# Altium footprint library Funk.PcbLib: 34 footprints (part 2 of 3)
Each footprint in its own frame and in the unit in brackets; x right, y up, seen from the top. Pads: shape width x height; smd on the part's side, far side on the other; paste and mask are expansions set on the pad; w line width, h text height; cw(c..) or ccw(c..) is an arc to the next point about the centre after c.
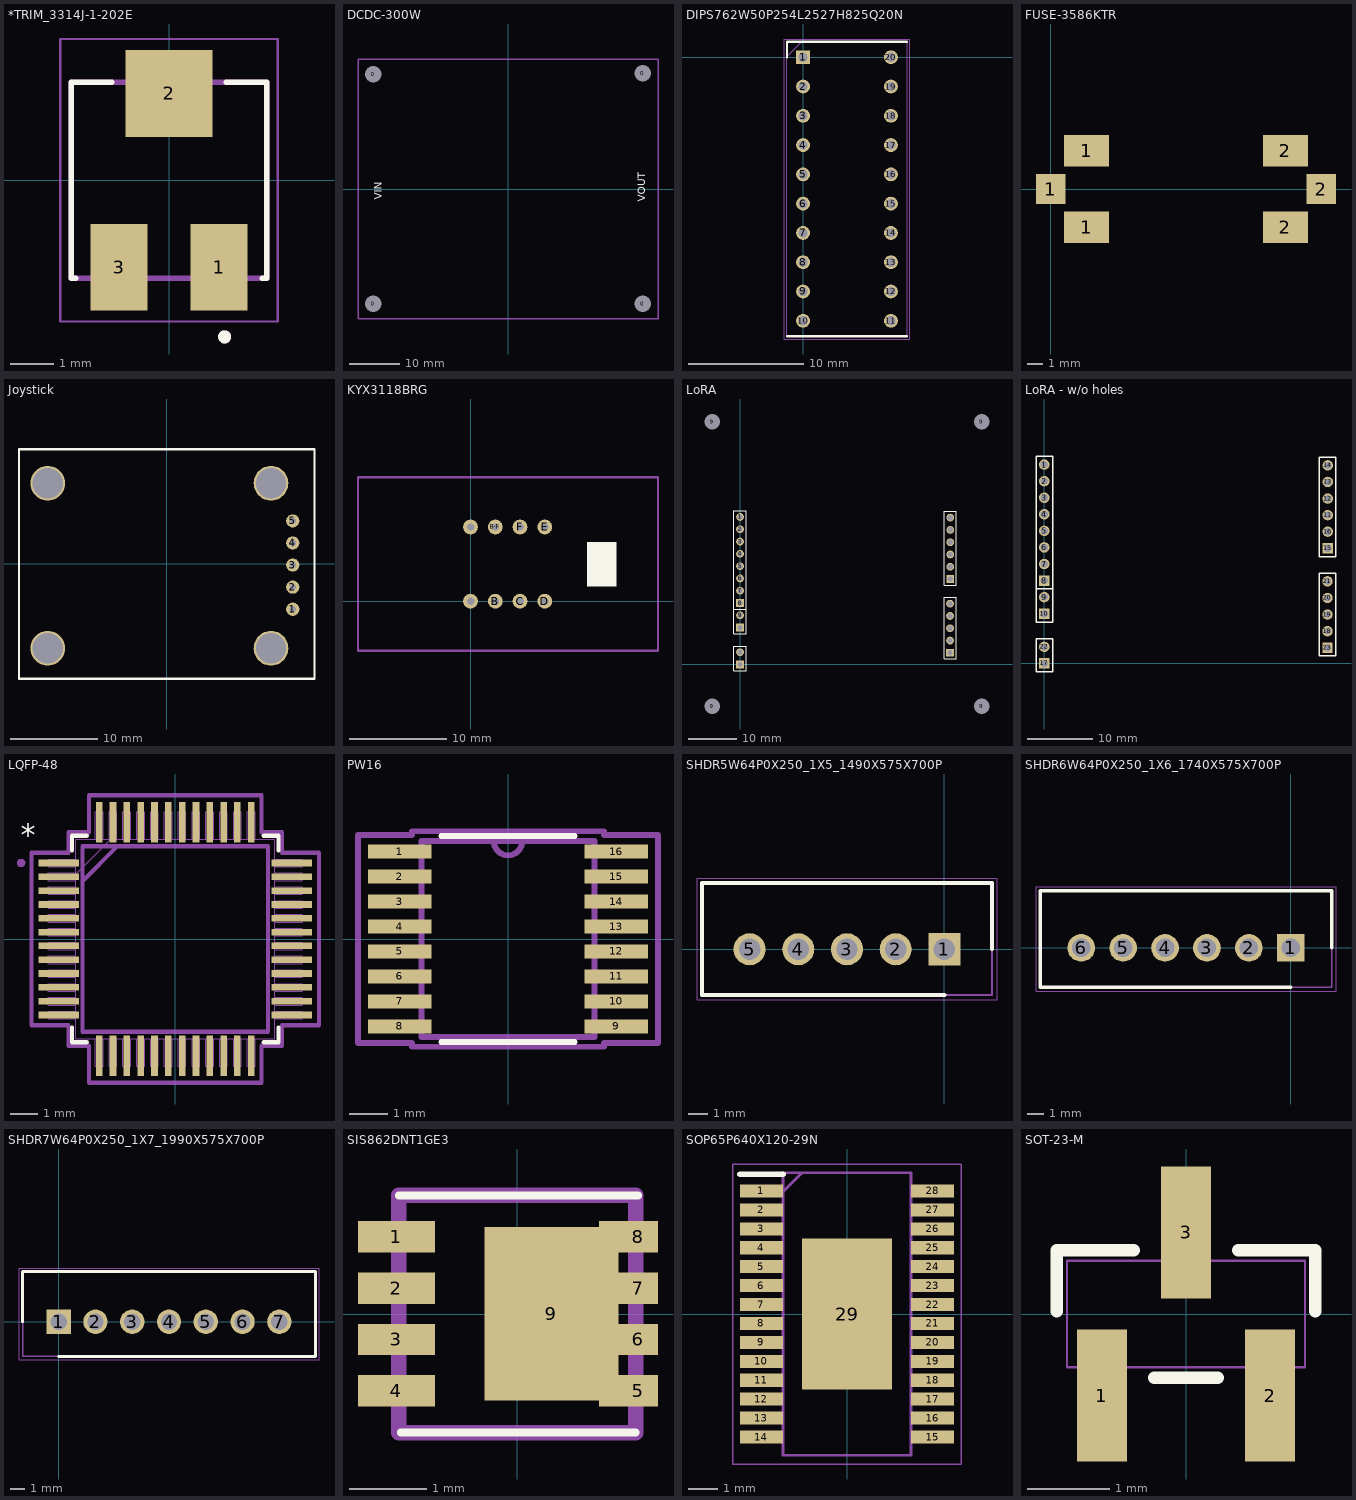
[diagram p1: the footprints below, top view; thin cyan lines are the x and y axes]

## *TRIM_3314J-1-202E [mm]
pads (3):
  rect 1.3x2 smd: 1(1.15,-2) 3(-1.15,-2)
  rect 2x2 smd: 2(0,2)
Top Overlay:
  circle w0.2: c1.28,-3.6 r0.05
  lines w0.127: -2.15,-2.25 -2.25,-2.25 -2.25,2.25 -1.315,2.25 ; 1.315,2.25 2.25,2.25 2.25,-2.25 2.15,-2.25
Mechanical 4:
  circle w0.2: c1.28,-3.6 r0.05
  circle w0.2: c1.28,-3.6 r0.05
  lines w0.127: -2.25,-2.25 -2.25,2.25 ; -2.25,-2.25 2.25,-2.25 ; -2.25,-2.25 -2.25,2.25 ; -2.25,-2.25 2.25,-2.25 ; -2.25,2.25 2.25,2.25 ; -2.25,2.25 2.25,2.25 ; 2.25,-2.25 2.25,2.25 ; 2.25,-2.25 2.25,2.25
Mechanical 16:
  lines w0.05: -2.5,-3.25 -2.5,3.25 2.5,3.25 2.5,-3.25 -2.5,-3.25
3D body "3314J1.stp": height 2.7, standoff -0.02, extent -2.5,-2.563 2.5,2.44

## DCDC-300W [mil] "6-36V 20A"
pads (4):
  round 60 hole 129.92 unplated: 0(-1060,-905) 0(-1060,905) 0(1060,-905) 0(1060,910)
Top Overlay:
  text "VOUT" at 1080,-100 h60
  text "VIN" at -995,-85 h60
Mechanical 1:
  lines w10: -1181.1,-1023.62 -1181.1,1023.62 1181.1,1023.62 1181.1,-1023.62 -1181.1,-1023.62
3D body "DCDC.STEP": height 1146.34, standoff 0, extent -1181.1,-1185.89 1181.1,1199.34

## DIPS762W50P254L2527H825Q20N [mm]
pads (20):
  rect 1.2x1.2 / inner round 1.2 / far side rect 1.2x1.2 hole 0.8: 1(0,0)
  round 1.2 hole 0.8: 2(0,-2.54) 3(0,-5.08) 4(0,-7.62) 5(0,-10.16) 6(0,-12.7) 7(0,-15.24) 8(0,-17.78) 9(0,-20.32) 10(0,-22.86) 11(7.62,-22.86) 12(7.62,-20.32) 13(7.62,-17.78) 14(7.62,-15.24) 15(7.62,-12.7) 16(7.62,-10.16) 17(7.62,-7.62) 18(7.62,-5.08) 19(7.62,-2.54) 20(7.62,0)
Top Overlay:
  lines w0.2: -1.395,-24.19 9.015,-24.19 ; -1.395,0 -1.395,1.33 9.015,1.33
Mechanical 15:
  lines w0.1: -1.395,0.06 -0.125,1.33 ; -1.395,-24.19 -1.395,1.33 9.015,1.33 9.015,-24.19 -1.395,-24.19
Mechanical 20:
  lines w0.05: -1.645,-24.44 -1.645,1.58 9.265,1.58 9.265,-24.44 -1.645,-24.44

## FUSE-3586KTR [mm]
pads (6):
  rect 1.9x1.9 smd: 1(0,0) 2(17.34,0)
  rect 2.9x2 smd: 1(2.29,-2.45) 1(2.29,2.45) 2(15.05,-2.45) 2(15.05,2.45)

## Joystick [mil]
pads (9):
  round 60 hole 30: 1(571.16,-205.04) 2(571.16,-105.04) 3(571.16,-5.04) 4(571.16,94.96) 5(571.16,194.96)
  round 157.48 hole 137.8 unplated: ""(-539.08,-382.2) ""(-539.08,365.83) ""(472.73,-382.2) ""(472.73,365.83)
Top Overlay:
  lines w10: -669,-520 669.58,-520 669.58,519.37 -669,519.37 -669,-520
Mechanical 1:
  pour cut-out: 630.21,503.62
  pour cut-out: -669,-244.41
  pour cut-out: -669,-520

## KYX3118BRG [mil]
pads (8):
  round 60 hole 30: A-IN(0,300) A-OUT(0,0) B(100,0) B-F(100,300) C(200,0) D(300,0) E(300,300) F(200,300)
Top Overlay:
  rectangle: 470,60 590,240
Mechanical 1:
  lines w10: -455,-200 -455,500.79 757.6,500.79 757.6,-200 -455,-200

## LoRA [mm]
pads (27):
  round 1.6 hole 1.1: 1(0,30.48) 2(0,27.94) 3(0,25.4) 4(0,22.86) 5(0,20.32) 6(0,17.78) 7(0,15.24) 9(0,10.16) 11(43.434,22.733) 12(43.434,25.273) 13(43.434,27.813) 14(43.434,30.353) 16(43.434,20.193) 18(43.4,4.953) 19(43.4,7.493) 20(43.4,10.033) 21(43.4,12.573) 22(0,2.54)
  rect 1.6x1.6 hole 1.1: 8(0,12.7) 10(0,7.62) 15(43.434,17.653) 17(0,0) 23(43.4,2.413)
  round 1.524 hole 3.2 unplated: 9(-5.715,-8.636) 9(-5.715,50.165) 9(49.911,-8.636) 9(49.911,50.165)
Top Overlay:
  lines w0.2: -1.27,3.81 -1.27,-1.27 1.27,-1.27 1.27,3.81 ; -1.27,3.81 1.27,3.81 ; -1.27,3.81 1.27,3.81 ; -1.27,11.43 1.27,11.43 ; -1.27,11.43 -1.27,31.75 1.27,31.75 1.27,11.43 ; -1.27,11.43 1.27,11.43 ; -1.27,11.43 -1.27,6.35 1.27,6.35 1.27,11.43 ; 42.164,1.143 44.704,1.143 44.704,13.843 42.164,13.843 42.164,1.143 ; 42.164,16.383 42.164,31.623 44.704,31.623 44.704,16.383 42.164,16.383
3D body "lora-modul.step": height 10.3, standoff -3, extent -8.7,-11.684 52.895,53.213

## LoRA - w/o holes [mm]
pads (23):
  round 1.6 hole 1.1: 1(0,30.48) 2(0,27.94) 3(0,25.4) 4(0,22.86) 5(0,20.32) 6(0,17.78) 7(0,15.24) 9(0,10.16) 11(43.434,22.733) 12(43.434,25.273) 13(43.434,27.813) 14(43.434,30.353) 16(43.434,20.193) 18(43.4,4.953) 19(43.4,7.493) 20(43.4,10.033) 21(43.4,12.573) 22(0,2.54)
  rect 1.6x1.6 hole 1.1: 8(0,12.7) 10(0,7.62) 15(43.434,17.653) 17(0,0) 23(43.4,2.413)
Top Overlay:
  lines w0.2: -1.27,3.81 1.27,3.81 ; -1.27,3.81 1.27,3.81 ; -1.27,3.81 -1.27,-1.27 1.27,-1.27 1.27,3.81 ; -1.27,11.43 -1.27,6.35 1.27,6.35 1.27,11.43 ; -1.27,11.43 1.27,11.43 ; -1.27,11.43 -1.27,31.75 1.27,31.75 1.27,11.43 ; -1.27,11.43 1.27,11.43 ; 42.164,1.143 42.164,13.843 44.704,13.843 44.704,1.143 42.164,1.143 ; 42.164,16.383 44.704,16.383 44.704,31.623 42.164,31.623 42.164,16.383
3D body "lora-modul.step": height 10.3, standoff -3, extent -8.7,-11.684 52.895,53.213

## LQFP-48 [mm]
pads (48):
  rect 1.462x0.239 smd: 1(-4.216,2.75) 2(-4.216,2.25) 3(-4.216,1.75) 4(-4.216,1.25) 5(-4.216,0.75) 6(-4.216,0.25) 7(-4.216,-0.25) 8(-4.216,-0.75) 9(-4.216,-1.25) 10(-4.216,-1.75) 11(-4.216,-2.25) 12(-4.216,-2.75) 25(4.216,-2.75) 26(4.216,-2.25) 27(4.216,-1.75) 28(4.216,-1.25) 29(4.216,-0.75) 30(4.216,-0.25) 31(4.216,0.25) 32(4.216,0.75) 33(4.216,1.25) 34(4.216,1.75) 35(4.216,2.25) 36(4.216,2.75)
  rect 0.239x1.462 smd: 13(-2.75,-4.216) 14(-2.25,-4.216) 15(-1.75,-4.216) 16(-1.25,-4.216) 17(-0.75,-4.216) 18(-0.25,-4.216) 19(0.25,-4.216) 20(0.75,-4.216) 21(1.25,-4.216) 22(1.75,-4.216) 23(2.25,-4.216) 24(2.75,-4.216) 37(2.75,4.216) 38(2.25,4.216) 39(1.75,4.216) 40(1.25,4.216) 41(0.75,4.216) 42(0.25,4.216) 43(-0.25,4.216) 44(-0.75,4.216) 45(-1.25,4.216) 46(-1.75,4.216) 47(-2.25,4.216) 48(-2.75,4.216)
Top Overlay:
  lines w0.152: -3.734,-3.202 -3.734,-3.734 -3.202,-3.734 ; -3.734,3.202 -3.734,3.734 -3.202,3.734 ; 3.202,-3.734 3.734,-3.734 3.734,-3.202 ; 3.202,3.734 3.734,3.734 3.734,3.202
  text "*" at -5.582,3.381 h0.79
Mechanical 1:
  drawing of 197 lines, arcs and shapes, not listed
  text "*" at -3.226,3 h0.79
Mechanical 16:
  circle w0.152: c-5.575,2.75 r0.076
  lines w0.152: -3.358,2.088 -2.088,3.358 ; -5.201,-3.124 -5.201,3.124 -3.861,3.124 -3.861,3.861 -3.124,3.861 -3.124,5.201 3.124,5.201 3.124,3.861 3.861,3.861 3.861,3.124 5.201,3.124 5.201,-3.124 3.861,-3.124 3.861,-3.861 3.124,-3.861 3.124,-5.201 -3.124,-5.201 -3.124,-3.861 -3.861,-3.861 -3.861,-3.124 -5.201,-3.124 ; -3.358,-3.358 3.358,-3.358 3.358,3.358 -3.358,3.358 -3.358,-3.358
3D body "LQFP-48.step": height 1.6, standoff 0, extent -4.597,-4.597 4.597,4.597

## PW16 [mm]
pads (16):
  rect 1.665x0.365 smd: 1(-2.819,2.275) 2(-2.819,1.625) 3(-2.819,0.975) 4(-2.819,0.325) 5(-2.819,-0.325) 6(-2.819,-0.975) 7(-2.819,-1.625) 8(-2.819,-2.275) 9(2.819,-2.275) 10(2.819,-1.625) 11(2.819,-0.975) 12(2.819,-0.325) 13(2.819,0.325) 14(2.819,0.975) 15(2.819,1.625) 16(2.819,2.275)
Top Overlay:
  lines w0.152: -1.739,-2.68 1.739,-2.68 ; -1.739,2.68 1.739,2.68
Mechanical 1:
  lines w0.025: -0.305,2.553 ccw(c0,2.553) 0.305,2.553 ; -3.302,-2.427 -2.248,-2.427 -2.248,-2.123 -3.302,-2.123 -3.302,-2.427 ; -3.302,-1.777 -2.248,-1.777 -2.248,-1.473 -3.302,-1.473 -3.302,-1.777 ; -3.302,-1.127 -2.248,-1.127 -2.248,-0.823 -3.302,-0.823 -3.302,-1.127 ; -3.302,-0.477 -2.248,-0.477 -2.248,-0.173 -3.302,-0.173 -3.302,-0.477 ; -3.302,0.173 -2.248,0.173 -2.248,0.477 -3.302,0.477 -3.302,0.173 ; -3.302,0.823 -2.248,0.823 -2.248,1.127 -3.302,1.127 -3.302,0.823 ; -3.302,1.473 -2.248,1.473 -2.248,1.777 -3.302,1.777 -3.302,1.473 ; -3.302,2.123 -2.248,2.123 -2.248,2.427 -3.302,2.427 -3.302,2.123 ; -2.248,-2.553 -2.248,2.553 2.248,2.553 2.248,-2.553 -2.248,-2.553 ; 2.248,-2.427 3.302,-2.427 3.302,-2.123 2.248,-2.123 2.248,-2.427 ; 2.248,-1.777 3.302,-1.777 3.302,-1.473 2.248,-1.473 2.248,-1.777 ; 2.248,-1.127 3.302,-1.127 3.302,-0.823 2.248,-0.823 2.248,-1.127 ; 2.248,-0.477 3.302,-0.477 3.302,-0.173 2.248,-0.173 2.248,-0.477 ; 2.248,0.173 3.302,0.173 3.302,0.477 2.248,0.477 2.248,0.173 ; 2.248,0.823 3.302,0.823 3.302,1.127 2.248,1.127 2.248,0.823 ; 2.248,1.473 3.302,1.473 3.302,1.777 2.248,1.777 2.248,1.473 ; 2.248,2.123 3.302,2.123 3.302,2.427 2.248,2.427 2.248,2.123
Mechanical 16:
  lines w0.152: -0.375,2.553 ccw(c0,2.553) 0.375,2.553 ; -3.906,-2.711 -2.502,-2.711 -2.502,-2.807 2.502,-2.807 2.502,-2.711 3.906,-2.711 3.906,2.711 2.502,2.711 2.502,2.807 -2.502,2.807 -2.502,2.711 -3.906,2.711 -3.906,-2.711 ; -2.248,-2.553 2.248,-2.553 2.248,2.553 -2.248,2.553 -2.248,-2.553
3D body "PW16.step": height 1.2, standoff 0, extent -3.302,-2.593 3.302,2.513

## SHDR5W64P0X250_1X5_1490X575X700P [mm]
pads (5):
  rect 1.65x1.65 / inner round 1.65 / far side rect 1.65x1.65 hole 1.1: 1(0,0)
  round 1.65 hole 1.1: 2(-2.5,0) 3(-5,0) 4(-7.5,0) 5(-10,0)
Top Overlay:
  lines w0.2: 0,-2.35 -12.45,-2.35 -12.45,3.4 2.45,3.4 2.45,0
Mechanical 15:
  lines w0.1: -12.45,-2.35 -12.45,3.4 2.45,3.4 2.45,-2.35 -12.45,-2.35
Mechanical 20:
  lines w0.05: -12.7,-2.6 -12.7,3.65 2.7,3.65 2.7,-2.6 -12.7,-2.6
3D body "jst-b5b-xh-a.step": height 7, standoff -3.4, extent -12.403,-3.337 2.497,2.413

## SHDR6W64P0X250_1X6_1740X575X700P [mm]
pads (6):
  rect 1.65x1.65 / inner round 1.65 / far side rect 1.65x1.65 hole 1.1: 1(0,0)
  round 1.65 hole 1.1: 2(-2.5,0) 3(-5,0) 4(-7.5,0) 5(-10,0) 6(-12.5,0)
Top Overlay:
  lines w0.2: 0,-2.35 -14.95,-2.35 -14.95,3.4 2.45,3.4 2.45,0
Mechanical 15:
  lines w0.1: -14.95,-2.35 2.45,-2.35 2.45,3.4 -14.95,3.4 -14.95,-2.35
Mechanical 20:
  lines w0.05: -15.2,-2.6 2.7,-2.6 2.7,3.65 -15.2,3.65 -15.2,-2.6
3D body "jst-b6b-xh-a.step": height 7, standoff -3.4, extent -14.923,-3.429 2.477,2.321

## SHDR7W64P0X250_1X7_1990X575X700P [mm]
pads (7):
  rect 1.65x1.65 / inner round 1.65 / far side rect 1.65x1.65 hole 1.1: 1(0,0)
  round 1.65 hole 1.1: 2(2.5,0) 3(5,0) 4(7.5,0) 5(10,0) 6(12.5,0) 7(15,0)
Top Overlay:
  lines w0.2: -2.45,0 -2.45,3.4 17.45,3.4 17.45,-2.35 0,-2.35
Mechanical 15:
  lines w0.1: -2.45,-2.35 -2.45,3.4 17.45,3.4 17.45,-2.35 -2.45,-2.35
Mechanical 20:
  lines w0.05: -2.7,-2.6 -2.7,3.65 17.7,3.65 17.7,-2.6 -2.7,-2.6
3D body "User Library-B7B-XH-A.step": height 7, standoff -3.4, extent -2.45,-2.35 17.45,3.4

## SIS862DNT1GE3 [mm]
pads (11):
  rect 0.99x0.405 smd: 1(-1.555,0.992) 2(-1.555,0.332) 3(-1.555,-0.328) 4(-1.555,-0.988)
  rect 0.51x0.405 smd: 5(1.555,-0.988) 6(1.555,-0.328) 7(1.555,0.332) 8(1.555,0.992)
  rect 1.725x2.235 smd: 9(0.438,0.002)
  rect 0.25x0.077 smd: 10(1.176,-1.15) 11(1.175,1.156)
Top Overlay:
  lines w0.1: -1.525,1.525 1.555,1.525 ; -1.5,-1.525 1.525,-1.525
Mechanical 13:
  lines w0.2: -1.525,-1.525 -1.525,1.525 1.525,1.525 1.525,-1.525 -1.525,-1.525

## SOP65P640X120-29N [mm]
pads (29):
  rect 1.475x0.45 smd: 1(-2.938,4.225) 2(-2.938,3.575) 3(-2.938,2.925) 4(-2.938,2.275) 5(-2.938,1.625) 6(-2.938,0.975) 7(-2.938,0.325) 8(-2.938,-0.325) 9(-2.938,-0.975) 10(-2.938,-1.625) 11(-2.938,-2.275) 12(-2.938,-2.925) 13(-2.938,-3.575) 14(-2.938,-4.225) 15(2.938,-4.225) 16(2.938,-3.575) 17(2.938,-2.925) 18(2.938,-2.275) 19(2.938,-1.625) 20(2.938,-0.975) 21(2.938,-0.325) 22(2.938,0.325) 23(2.938,0.975) 24(2.938,1.625) 25(2.938,2.275) 26(2.938,2.925) 27(2.938,3.575) 28(2.938,4.225)
  rect 3.1x5.18 smd: 29(0,0)
Top Overlay:
  lines w0.2: -3.675,4.8 -2.2,4.8
Mechanical 15:
  lines w0.1: -2.2,4.2 -1.55,4.85 ; -2.2,-4.85 2.2,-4.85 2.2,4.85 -2.2,4.85 -2.2,-4.85
Mechanical 20:
  lines w0.05: -3.925,-5.15 3.925,-5.15 3.925,5.15 -3.925,5.15 -3.925,-5.15
3D body "DRV8840PWP.stp": height 1.2, standoff 0, extent -3.2,-4.85 3.2,4.85

## SOT-23-M [mm]
pads (3):
  rect 0.61x1.61 smd paste+0 mask+0: 1(-1.025,-0.995) 2(1.025,-0.995) 3(0,0.995)
Top Overlay:
  lines w0.152: -1.577,0.033 -1.577,0.777 -0.638,0.777 ; -0.387,-0.777 0.387,-0.777 ; 0.638,0.777 1.577,0.777 1.577,0.033
Mechanical 13:
  circle w0: c-1.196,-0.396 r0.127
  lines w0.025: -1.45,-0.65 -1.45,0.65 1.45,0.65 1.45,-0.65 -1.45,-0.65 ; -1.28,-1.25 -0.77,-1.25 -0.77,-0.65 -1.28,-0.65 -1.28,-1.25 ; -0.255,0.65 -0.255,1.25 0.255,1.25 0.255,0.65 -0.255,0.65 ; 0.77,-1.25 1.28,-1.25 1.28,-0.65 0.77,-0.65 0.77,-1.25
3D body: height 0.25, standoff 0, extent 0,0 0.254,0.254
3D body "SOT-23.step": height 1.06, standoff -0.04, extent -1.5,-1.25 1.5,1.25